# Altium footprint library IC.PCBLIB: 359 footprints (part 23 of 23)
Each footprint in its own frame and in the unit in brackets; x right, y up, seen from the top. Pads: shape width x height; smd on the part's side, far side on the other; paste and mask are expansions set on the pad; w line width, h text height; cw(c..) or ccw(c..) is an arc to the next point about the centre after c.
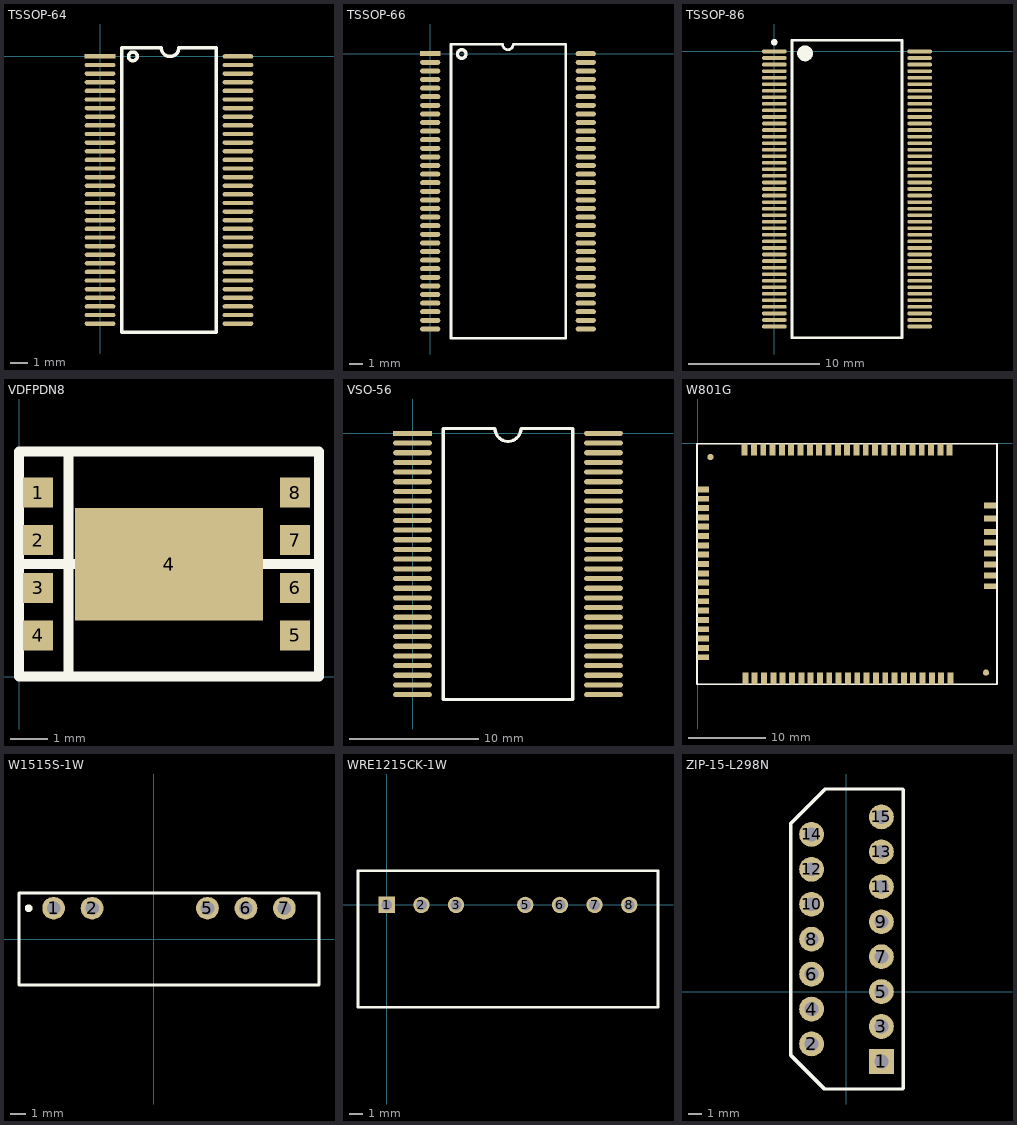
[diagram p22: the footprints below, top view; thin cyan lines are the x and y axes]

## TSSOP-64 [mil]
pads (64):
  rect 70x10 smd: 1(0,0)
  oval 70x10 smd: 2(0,-19.69) 3(0,-39.37) 4(0,-59.06) 5(0,-78.74) 6(0,-98.43) 7(0,-118.11) 8(0,-137.8) 9(0,-157.48) 10(0,-177.17) 11(0,-196.85) 12(0,-216.54) 13(0,-236.22) 14(0,-255.91) 15(0,-275.59) 16(0,-295.28) 17(0,-314.96) 18(0,-334.65) 19(0,-354.33) 20(0,-374.02) 21(0,-393.7) 22(0,-413.39) 23(0,-433.07) 24(0,-452.76) 25(0,-472.44) 26(0,-492.13) 27(0,-511.81) 28(0,-531.5) 29(0,-551.18) 30(0,-570.87) 31(0,-590.55) 32(0,-610.24) 33(314.96,-610.24) 34(314.96,-590.55) 35(314.96,-570.87) 36(314.96,-551.18) 37(314.96,-531.5) 38(314.96,-511.81) 39(314.96,-492.13) 40(314.96,-472.44) 41(314.96,-452.76) 42(314.96,-433.07) 43(314.96,-413.39) 44(314.96,-393.7) 45(314.96,-374.02) 46(314.96,-354.33) 47(314.96,-334.65) 48(314.96,-314.96) 49(314.96,-295.28) 50(314.96,-275.59) 51(314.96,-255.91) 52(314.96,-236.22) 53(314.96,-216.54) 54(314.96,-196.85) 55(314.96,-177.17) 56(314.96,-157.48) 57(314.96,-137.79) 58(314.96,-118.11) 59(314.96,-98.42) 60(314.96,-78.74) 61(314.96,-59.05) 62(314.96,-39.37) 63(314.96,-19.68) 64(314.96,0)
TopOverlay:
  circle w8: c75,0 r10
  lines w8: 49.21,-629.92 49.21,19.68 140,19.68 ccw(c160,19.68) 180,19.68 265.75,19.68 265.75,-629.92 49.21,-629.92

## TSSOP-66 [mil]
pads (66):
  rect 60x15 smd: 1(0,0)
  oval 60x15 smd: 2(0,-25.59) 3(0,-51.18) 4(0,-76.77) 5(0,-102.36) 6(0,-127.95) 7(0,-153.54) 8(0,-179.13) 9(0,-204.72) 10(0,-230.31) 11(0,-255.91) 12(0,-281.5) 13(0,-307.09) 14(0,-332.68) 15(0,-358.27) 16(0,-383.86) 17(0,-409.45) 18(0,-435.04) 19(0,-460.63) 20(0,-486.22) 21(0,-511.81) 22(0,-537.4) 23(0,-562.99) 24(0,-588.58) 25(0,-614.17) 26(0,-639.76) 27(0,-665.35) 28(0,-690.94) 29(0,-716.54) 30(0,-742.13) 31(0,-767.72) 32(0,-793.31) 33(0,-818.9) 34(463,-818.9) 35(463,-793.31) 36(463,-767.72) 37(463,-742.13) 38(463,-716.54) 39(463,-690.94) 40(463,-665.35) 41(463,-639.76) 42(463,-614.17) 43(463,-588.58) 44(463,-562.99) 45(463,-537.4) 46(463,-511.81) 47(463,-486.22) 48(463,-460.63) 49(463,-435.04) 50(463,-409.45) 51(463,-383.86) 52(463,-358.27) 53(463,-332.68) 54(463,-307.09) 55(463,-281.5) 56(463,-255.91) 57(463,-230.31) 58(463,-204.72) 59(463,-179.13) 60(463,-153.54) 61(463,-127.95) 62(463,-102.36) 63(463,-76.77) 64(463,-51.18) 65(463,-25.59) 66(463,0)
TopOverlay:
  circle w10: c93.79,-0.75 r12.81
  lines w7.87: 246.91,28 cw(c231.09,28) 215.27,28 62,28 62,-846.8 400.19,-846.8 ; 249.73,28 403,28 403,-846.8

## TSSOP-86 [mm]
pads (86):
  oval 1.9x0.279 smd: 1(0,0) 2(0,-0.5) 3(0,-1) 4(0,-1.5) 5(0,-2) 6(0,-2.5) 7(0,-3) 8(0,-3.5) 9(0,-4) 10(0,-4.5) 11(0,-5) 12(0,-5.5) 13(0,-6) 14(0,-6.5) 15(0,-7) 16(0,-7.5) 17(0,-8) 18(0,-8.5) 19(0,-9) 20(0,-9.5) 21(0,-10) 22(0,-10.5) 23(0,-11) 24(0,-11.5) 25(0,-12) 26(0,-12.5) 27(0,-13) 28(0,-13.5) 29(0,-14) 30(0,-14.5) 31(0,-15) 32(0,-15.5) 33(0,-16) 34(0,-16.5) 35(0,-17) 36(0,-17.5) 37(0,-18) 38(0,-18.5) 39(0,-19) 40(0,-19.5) 41(0,-20) 42(0,-20.5) 43(0,-21) 44(11.1,-21) 45(11.1,-20.5) 46(11.1,-20) 47(11.1,-19.5) 48(11.1,-19) 49(11.1,-18.5) 50(11.1,-18) 51(11.1,-17.5) 52(11.1,-17) 53(11.1,-16.5) 54(11.1,-16) 55(11.1,-15.5) 56(11.1,-15) 57(11.1,-14.5) 58(11.1,-14) 59(11.1,-13.5) 60(11.1,-13) 61(11.1,-12.5) 62(11.1,-12) 63(11.1,-11.5) 64(11.1,-11) 65(11.1,-10.5) 66(11.1,-10) 67(11.1,-9.5) 68(11.1,-9) 69(11.1,-8.5) 70(11.1,-8) 71(11.1,-7.5) 72(11.1,-7) 73(11.1,-6.5) 74(11.1,-6) 75(11.1,-5.5) 76(11.1,-5) 77(11.1,-4.5) 78(11.1,-4) 79(11.1,-3.5) 80(11.1,-3) 81(11.1,-2.5) 82(11.1,-2) 83(11.1,-1.5) 84(11.1,-1) 85(11.1,-0.5) 86(11.1,0)
TopOverlay:
  circle w0.25: c0,0.7 r0.125
  circle w0.6: c2.35,-0.15 r0.3
  lines w0.2: 1.35,-21.85 1.35,0.85 9.75,0.85 9.75,-21.85 1.35,-21.85

## VDFPDN8 [mm]
pads (9):
  rect 0.8x0.8 smd: 1(0.508,4.905) 2(0.508,3.635) 3(0.508,2.365) 4(0.508,1.095) 5(7.366,1.095) 6(7.366,2.365) 7(7.366,3.635) 8(7.366,4.905)
  rect 5x3 smd: 4(4,3)
TopOverlay:
  lines w0.254: 0,3 8,3 7.952,3.048 ; 1.32,0 1.32,6 ; 0,0 0,6 8,6 8,0 0,0

## VSO-56 [mm]
pads (56):
  rect 3x0.4 smd: 1(0,0)
  oval 3x0.4 smd: 2(0,-0.75) 3(0,-1.5) 4(0,-2.25) 5(0,-3) 6(0,-3.75) 7(0,-4.5) 8(0,-5.25) 9(0,-6) 10(0,-6.75) 11(0,-7.5) 12(0,-8.25) 13(0,-9) 14(0,-9.75) 15(0,-10.5) 16(0,-11.25) 17(0,-12) 18(0,-12.75) 19(0,-13.5) 20(0,-14.25) 21(0,-15) 22(0,-15.75) 23(0,-16.5) 24(0,-17.25) 25(0,-18) 26(0,-18.75) 27(0,-19.5) 28(0,-20.25) 29(14.8,-20.25) 30(14.8,-19.5) 31(14.8,-18.75) 32(14.8,-18) 33(14.8,-17.25) 34(14.8,-16.5) 35(14.8,-15.75) 36(14.8,-15) 37(14.8,-14.25) 38(14.8,-13.5) 39(14.8,-12.75) 40(14.8,-12) 41(14.8,-11.25) 42(14.8,-10.5) 43(14.8,-9.75) 44(14.8,-9) 45(14.8,-8.25) 46(14.8,-7.5) 47(14.8,-6.75) 48(14.8,-6) 49(14.8,-5.25) 50(14.8,-4.5) 51(14.8,-3.75) 52(14.8,-3) 53(14.8,-2.25) 54(14.8,-1.5) 55(14.8,-0.75) 56(14.8,0)
TopOverlay:
  lines w0.25: 2.385,-20.625 12.415,-20.625 12.415,0.375 8.4,0.375 cw(c7.4,0.375) 6.4,0.375 2.385,0.375 2.385,-20.625

## W801G [mil]
pads (75):
  rect 30x60 smd: 1(1276.58,-31) 2(1229.34,-31) 3(1182.1,-31) 4(1134.85,-31) 5(1087.61,-31) 6(1040.36,-31) 7(993.12,-31) 8(945.88,-31) 9(898.63,-31) 10(851.39,-31) 11(804.14,-31) 12(756.9,-31) 13(709.66,-31) 14(662.41,-31) 15(615.17,-31) 16(567.92,-31) 17(520.68,-31) 18(473.43,-31) 19(426.19,-31) 20(378.95,-31) 21(331.7,-31) 22(284.46,-31) 23(237.21,-31) 43(241.21,-1191) 44(288.46,-1191) 45(335.7,-1191) 46(382.95,-1191) 47(430.19,-1191) 48(477.43,-1191) 49(524.68,-1191) 50(571.92,-1191) 51(619.17,-1191) 52(666.41,-1191) 53(713.66,-1191) 54(760.9,-1191) 55(808.14,-1191) 56(855.39,-1191) 57(902.63,-1191) 58(949.88,-1191) 59(997.12,-1191) 60(1044.36,-1191) 61(1091.61,-1191) 62(1138.85,-1191) 63(1186.1,-1191) 64(1233.34,-1191) 65(1280.58,-1191)
  rect 60x30 smd: 24(28.21,-233) 25(28.21,-280.24) 26(28.21,-327.49) 27(28.21,-374.73) 28(28.21,-421.98) 29(28.21,-469.22) 30(28.21,-516.46) 31(28.21,-563.71) 32(28.21,-610.95) 33(28.21,-658.2) 34(28.21,-705.44) 35(28.21,-752.68) 36(28.21,-799.93) 37(28.21,-847.17) 38(28.21,-894.42) 39(28.21,-941.66) 40(28.21,-988.9) 41(28.21,-1036.15) 42(28.21,-1083.39) 66(1481.21,-723.59) 67(1481.21,-668.47) 68(1481.21,-613.35) 69(1481.21,-558.24) 70(1481.21,-503.12) 71(1481.21,-448) 72(1481.21,-381.07) 73(1481.21,-314.14)
  round 31.5 smd: ""(64.44,-69.26) ""(1460.44,-1161.26)
TopOverlay:
  lines w8: -3.79,-1221 1516.21,-1221 1516.21,-1 -3.79,-1 -3.79,-1221

## W1515S-1W [mm] "金升阳DC-DC模块"
pads (5):
  round 1.5 hole 0.9: 1(-6.604,2.032) 2(-4.064,2.032) 5(3.556,2.032) 6(6.096,2.032) 7(8.636,2.032)
TopOverlay:
  circle w0.254: c-8.255,2.032 r0.127
  lines w0.2: -8.89,-3.048 -8.89,3.048 10.922,3.048 10.922,-3.048 -8.89,-3.048

## WRE1215CK-1W [mm] "DC-DC"
pads (7):
  rect 1.2x1.2 hole 0.8: 1(0,0)
  round 1.2 hole 0.8: 2(2.54,0) 3(5.08,0) 5(10.16,0) 6(12.7,0) 7(15.24,0) 8(17.78,0)
TopOverlay:
  lines w0.2: -2.11,-7.5 -2.11,2.5 19.89,2.5 19.89,-7.5 -2.11,-7.5

## ZIP-15-L298N [mm] "直插封装"
pads (15):
  rect 1.8x1.8 hole 1: 1(2.54,-5.08)
  round 1.8 hole 1: 2(-2.54,-3.81) 3(2.54,-2.54) 4(-2.54,-1.27) 5(2.54,0) 6(-2.54,1.27) 7(2.54,2.54) 8(-2.54,3.81) 9(2.54,5.08) 10(-2.54,6.35) 11(2.54,7.62) 12(-2.54,8.89) 13(2.54,10.16) 14(-2.54,11.43) 15(2.54,12.7)
TopOverlay:
  lines w0.254: -4.039,-4.648 -4.039,12.243 -1.549,14.732 4.064,14.732 4.115,14.681 4.115,-7.036 4.064,-7.087 -1.6,-7.087 -4.039,-4.648